# Altium footprint library mainLib.PcbLib: 169 footprints (part 11 of 11)
Each footprint in its own frame and in the unit in brackets; x right, y up, seen from the top. Pads: shape width x height; smd on the part's side, far side on the other; paste and mask are expansions set on the pad; w line width, h text height; cw(c..) or ccw(c..) is an arc to the next point about the centre after c.
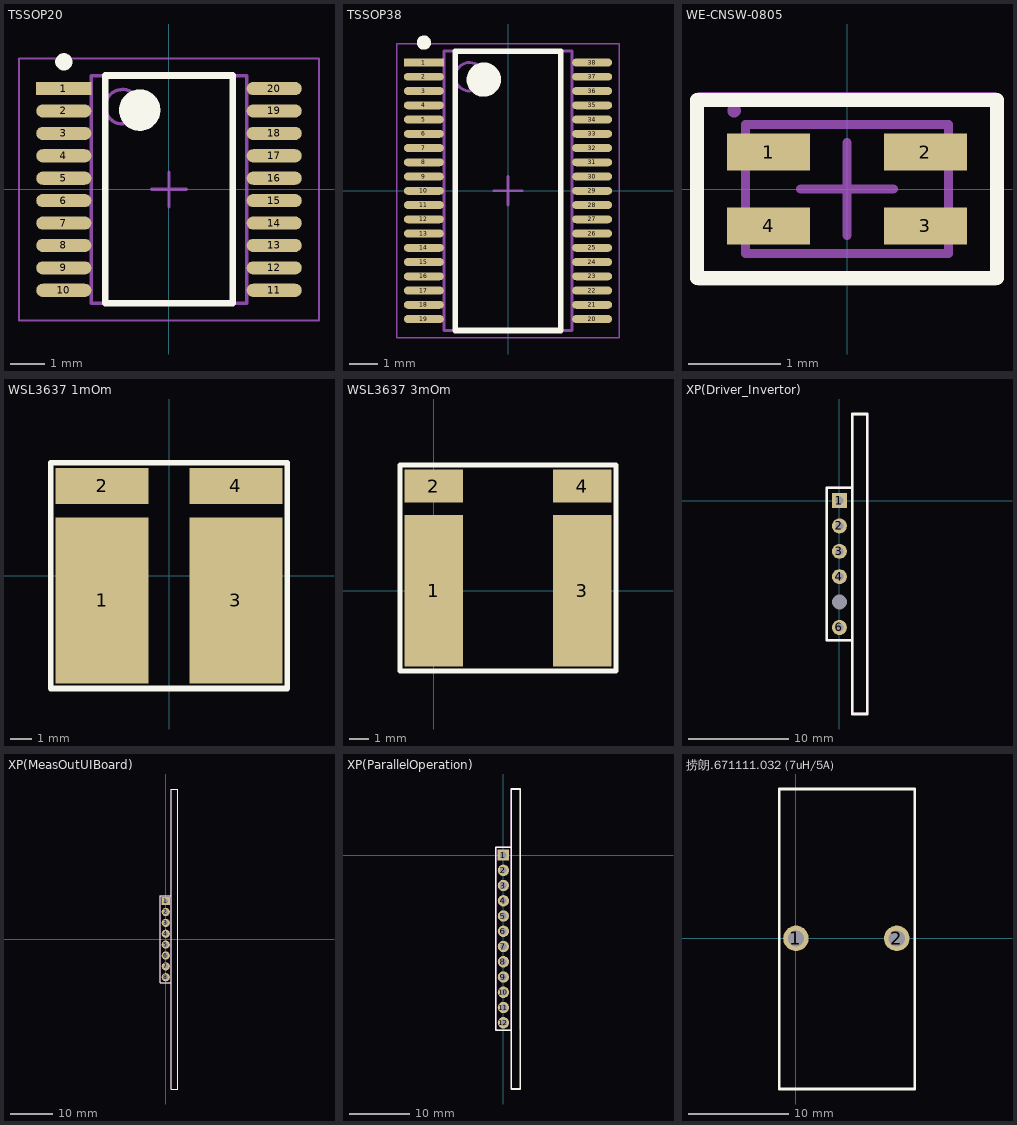
[diagram p10: the footprints below, top view; thin cyan lines are the x and y axes]

## TSSOP20 [mm] "SOP, 20-Leads, Body 6.6x4.5mm, Pitch 0.65mm, IPC Low Density"
height 1.2
pads (20):
  rect 1.6x0.381 smd: 1(-3.05,2.925)
  oval 1.6x0.381 smd: 2(-3.05,2.275) 3(-3.05,1.625) 4(-3.05,0.975) 5(-3.05,0.325) 6(-3.05,-0.325) 7(-3.05,-0.975) 8(-3.05,-1.625) 9(-3.05,-2.275) 10(-3.05,-2.925) 11(3.05,-2.925) 12(3.05,-2.275) 13(3.05,-1.625) 14(3.05,-0.975) 15(3.05,-0.325) 16(3.05,0.325) 17(3.05,0.975) 18(3.05,1.625) 19(3.05,2.275) 20(3.05,2.925)
Top Overlay:
  circle w0.25: c-3.05,3.7 r0.125
  circle w0.6: c-0.85,2.3 r0.3
  lines w0.2: -1.85,-3.3 -1.85,3.3 1.85,3.3 1.85,-3.3 -1.85,-3.3
Mechanical 13:
  circle w0.1: c-1.35,2.4 r0.5
  lines w0.1: -2.25,-3.3 -2.25,3.3 2.25,3.3 2.25,-3.3 -2.25,-3.3
Mechanical 15:
  lines w0.05: -4.35,-3.8 -4.35,3.8 4.35,3.8 4.35,-3.8 -4.35,-3.8
  lines w0.1: -0.5,0 0.5,0 ; 0,-0.5 0,0.5
3D body "PW0020AakaMTC20.stp": height 1.2, standoff 0, extent -3.21,-3.25 3.21,3.25

## TSSOP38 [mm] "TSSOP, 38-Leads, Body 9,70x4,40mm, Pitch 0,50mm, IPC Medium Density"
height 1.2
pads (38):
  rect 1.4x0.279 smd: 1(-2.95,4.5)
  oval 1.4x0.279 smd: 2(-2.95,4) 3(-2.95,3.5) 4(-2.95,3) 5(-2.95,2.5) 6(-2.95,2) 7(-2.95,1.5) 8(-2.95,1) 9(-2.95,0.5) 10(-2.95,0) 11(-2.95,-0.5) 12(-2.95,-1) 13(-2.95,-1.5) 14(-2.95,-2) 15(-2.95,-2.5) 16(-2.95,-3) 17(-2.95,-3.5) 18(-2.95,-4) 19(-2.95,-4.5) 20(2.95,-4.5) 21(2.95,-4) 22(2.95,-3.5) 23(2.95,-3) 24(2.95,-2.5) 25(2.95,-2) 26(2.95,-1.5) 27(2.95,-1) 28(2.95,-0.5) 29(2.95,0) 30(2.95,0.5) 31(2.95,1) 32(2.95,1.5) 33(2.95,2) 34(2.95,2.5) 35(2.95,3) 36(2.95,3.5) 37(2.95,4) 38(2.95,4.5)
Top Overlay:
  circle w0.6: c-0.85,3.9 r0.3
  circle w0.25: c-2.95,5.2 r0.125
  lines w0.2: -1.85,-4.9 1.85,-4.9 1.85,4.9 -1.85,4.9 -1.85,-4.9
Mechanical 13:
  circle w0.1: c-1.35,4 r0.5
  lines w0.1: -2.25,-4.9 2.25,-4.9 2.25,4.9 -2.25,4.9 -2.25,-4.9
Mechanical 15:
  lines w0.05: -3.9,-5.15 3.9,-5.15 3.9,5.15 -3.9,5.15 -3.9,-5.15
  lines w0.1: -0.5,0 0.5,0 ; 0,-0.5 0,0.5
3D body "TSSOP50P640X120-38N.step": height 1.2, standoff 0, extent -3.2,-4.9 3.2,4.9

## WE-CNSW-0805 [mm] "SMD Inductor, 4-Leads, Body 1.4x2.2x1.4 mm"
height 1.4
pads (4):
  rect 0.9x0.4 smd: 1(-0.85,0.4) 2(0.85,0.4) 3(0.85,-0.4) 4(-0.85,-0.4)
Top Overlay:
  lines w0.152: -1.626,-0.965 1.626,-0.965 1.626,0.965 -1.626,0.965 -1.626,-0.965
Mechanical 13:
  circle w0.1: c-1.224,0.85 r0.024
  lines w0.1: -1.1,-0.7 -1.1,0.7 1.1,0.7 1.1,-0.7 -1.1,-0.7
Mechanical 15:
  lines w0.1: -0.5,0 0.5,0 ; 0,-0.5 0,0.5 ; -1.6,-1 -1.6,1 1.6,1 1.6,-1 -1.6,-1
3D body "744231371.stp": height 1.18, standoff -0.02, extent -1,-0.6 1,0.6

## WSL3637 1mOm [mm]
pads (4):
  rect 4.27x7.64 smd: 1(-3.075,-1.125) 3(3.075,-1.125)
  rect 4.27x1.66 smd: 2(-3.075,4.135) 4(3.075,4.135)
Top Overlay:
  lines w0.254: -5.425,-5.175 -5.425,5.2 5.425,5.2 5.425,-5.175 -5.425,-5.175
3D body "WSL3637 (0.001 to 0.0019).stp": height 0.64, standoff 0, extent -4.595,-4.475 4.545,4.925

## WSL3637 3mOm [mm]
pads (4):
  rect 2.95x7.64 smd: 1(0,0) 3(7.47,0)
  rect 2.95x1.66 smd: 2(0,5.26) 4(7.47,5.26)
Top Overlay:
  lines w0.254: -1.7,-4.05 -1.7,6.325 9.175,6.325 9.175,-4.05 -1.7,-4.05
3D body "WSL3637 (0.002 to 0.01).STEP": height 0.64, standoff 0, extent -0.872,-3.448 8.272,5.95

## XP(Driver_Invertor) [mm]
pads (6):
  rect 1.5x1.5 hole 0.8: 1(0,0)
  round 1.5 hole 0.8: 2(0,-2.54) 3(0,-5.08) 4(0,-7.62) 6(0,-12.7)
  round 0 hole 1.5: 5(0,-10.16)
Top Overlay:
  lines w0.254: 1.27,1.27 1.27,-21.336 1.284,-21.35 2.775,-21.35 2.775,8.65 1.275,8.65 1.27,8.645 1.27,1.27 ; 1.27,1.27 0,1.27 -1.27,1.27 -1.27,-13.97 1.27,-13.97 1.27,1.27
Mechanical 13:
  lines w0.254: -1.27,-13.97 1.27,-13.97 1.27,1.27 -1.27,1.27 -1.27,-13.97 ; 1.27,-21.336 1.27,8.636 2.794,8.636 2.794,-21.336 1.27,-21.336
3D body: height 2.5, standoff 0, extent -1.269,-13.969 1.269,1.269
3D body: height 40, standoff 0, extent 1.271,-21.335 2.793,8.635

## XP(MeasOutUIBoard) [mm]
pads (8):
  rect 1.9x1.9 hole 1.1: 1(0,8.89)
  round 1.9 hole 1.1: 2(0,6.35) 3(0,3.81) 4(0,1.27) 5(0,-1.27) 6(0,-3.81) 7(0,-6.35) 8(0,-8.89)
Top Overlay:
  lines w0.254: 1.27,10.16 1.27,-10.16 -1.27,-10.16 -1.27,10.16 0,10.16 1.27,10.16 ; 1.27,10.16 1.27,-34.976 2.8,-34.976 2.8,35.065 1.27,35.065 1.27,10.16
Mechanical 13:
  lines w0.254: -1.27,-10.16 -1.27,10.16 1.27,10.16 1.27,-10.16 -1.27,-10.16 ; 1.27,-34.976 2.794,-34.976 2.794,35.065 1.27,35.065 1.27,-34.976
3D body: height 2.5, standoff 0, extent -1.269,-10.16 1.269,10.159
3D body: height 45, standoff 0, extent 1.271,-34.976 2.794,35.065

## XP(ParallelOperation) [mm]
pads (12):
  rect 1.9x1.9 hole 1.1: 1(0,0)
  round 1.9 hole 1.1: 2(0,-2.54) 3(0,-5.08) 4(0,-7.62) 5(0,-10.16) 6(0,-12.7) 7(0,-15.24) 8(0,-17.78) 9(0,-20.32) 10(0,-22.86) 11(0,-25.4) 12(0,-27.94)
Top Overlay:
  lines w0.254: 1.27,1.27 1.27,-29.2 -1.27,-29.2 -1.27,1.27 0,1.27 1.27,1.27 ; 1.27,1.27 1.27,11 2.8,11 2.8,-38.975 1.27,-38.975 1.27,1.27
Mechanical 13:
  lines w0.254: 1.27,-38.94 2.794,-38.94 ; 1.27,-29 1.27,11 2.794,11 2.794,-29 ; -1.27,-29.2 -1.27,1.27 1.27,1.27 1.27,-29.2 -1.27,-29.2
3D body: height 45, standoff 0, extent 1.271,-38.975 2.793,11
3D body: height 2.5, standoff 0, extent -1.269,-29.2 1.269,1.269

## 捞朗.671111.032 (7uH/5A) [mil]
pads (2):
  round 100 hole 63: 1(0,0) 2(395,0)
Top Overlay:
  lines w10: -65,-590 465,-590 465,-575 465,585 455,585 -65,585 -65,550 -65,-585 -65,-590
3D body: height 1120, standoff 0, extent -25,-564.85 430,554.85
3D body: height 455, standoff 0, extent -104.98,-314.98 524.98,314.98